# Altium footprint library Master.PcbLib: 28 footprints (part 2 of 2)
Each footprint in its own frame and in the unit in brackets; x right, y up, seen from the top. Pads: shape width x height; smd on the part's side, far side on the other; paste and mask are expansions set on the pad; w line width, h text height; cw(c..) or ccw(c..) is an arc to the next point about the centre after c.
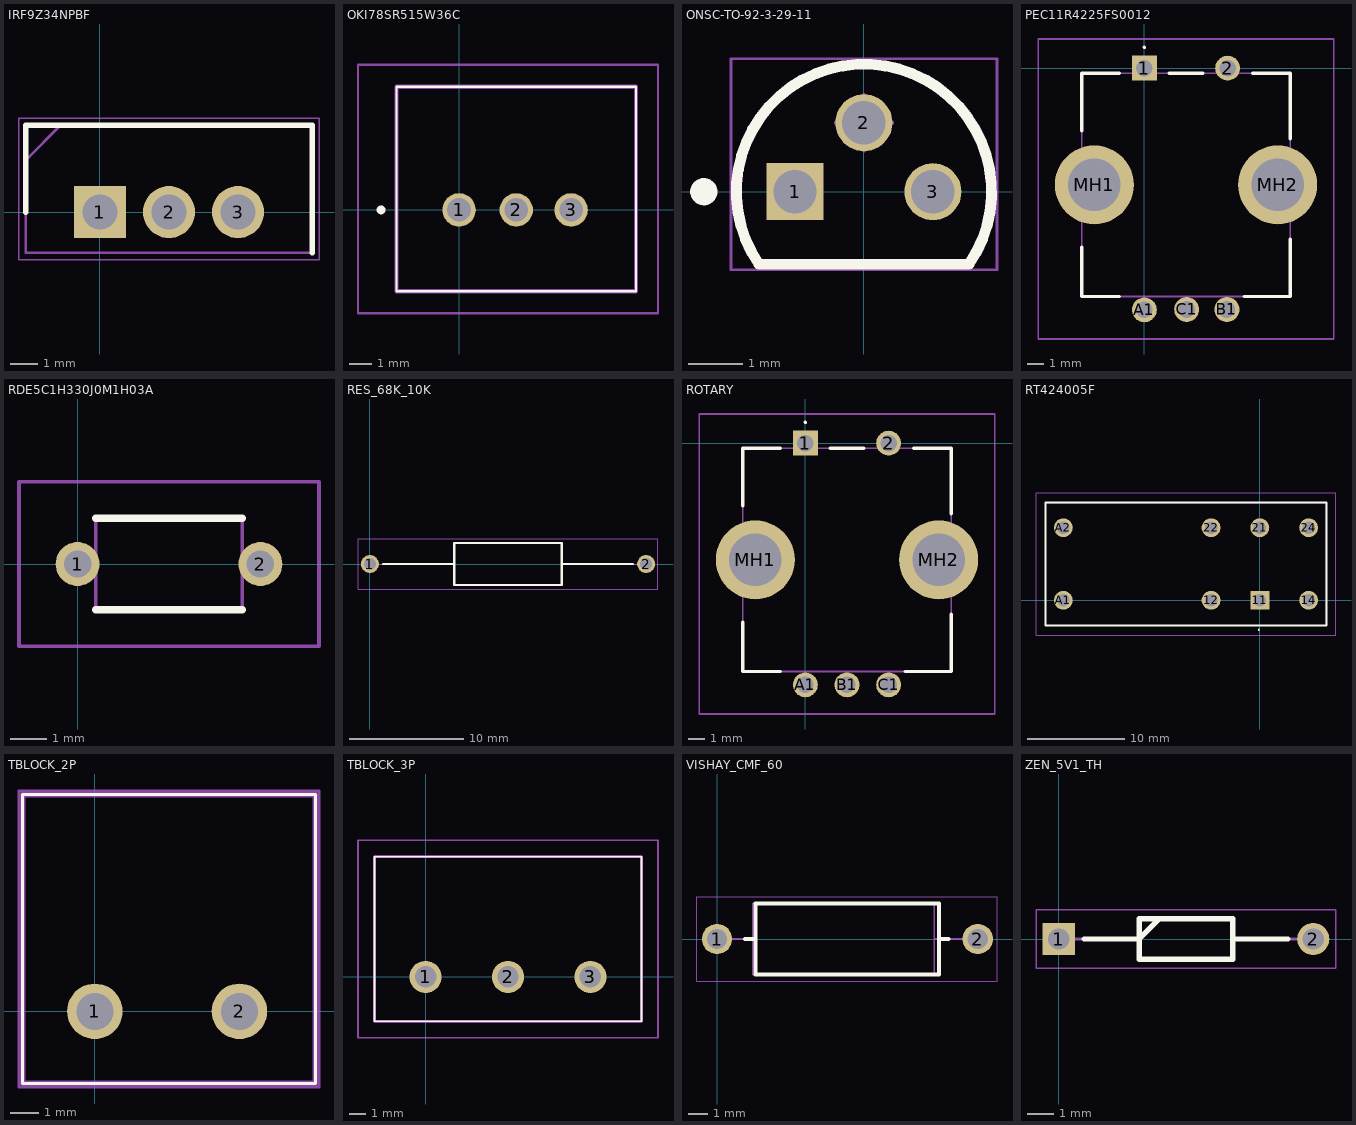
[diagram p1: the footprints below, top view; thin cyan lines are the x and y axes]

## IRF9Z34NPBF [mm] "MOSFET MOSFT PCh -55V -17A 100mOhm 23.3nC"
pads (3):
  rect 1.92x1.92 / inner round 1.92 / far side rect 1.92x1.92 hole 1.28: 1(0,0)
  round 1.92 hole 1.28: 2(2.54,0) 3(5.08,0)
Top Overlay:
  lines w0.2: -2.73,0 -2.73,3.195 7.81,3.195 7.81,-1.495
Mechanical 15:
  lines w0.1: -2.73,1.925 -1.46,3.195 ; -2.73,-1.495 -2.73,3.195 7.81,3.195 7.81,-1.495 -2.73,-1.495
Mechanical 20:
  lines w0.05: -2.98,-1.745 -2.98,3.445 8.06,3.445 8.06,-1.745 -2.98,-1.745
3D body "IRF9Z34NPBF.stp": height 18.84, standoff -17.51, extent -2.668,-1.495 7.748,3.195

## OKI78SR515W36C [mm]
pads (3):
  round 1.519 hole 1.08: 1(0,0) 2(2.6,0) 3(5.1,0)
Top Overlay:
  lines w0.1: -2.85,-3.7 8.05,-3.7 8.05,5.6 -2.85,5.6 -2.85,-3.7
  lines w0.3: -3.6,0 cw(c-3.55,0) -3.5,0 cw(c-3.55,0) -3.6,0
Mechanical 13:
  lines w0.2: -2.85,-3.7 8.05,-3.7 8.05,5.6 -2.85,5.6 -2.85,-3.7
Mechanical 15:
  lines w0.1: -4.6,-4.7 9.05,-4.7 9.05,6.6 -4.6,6.6 -4.6,-4.7
3D body "OKI-78SR-5_1.5-W36-C.stp": height 16.6, standoff -5, extent -2.85,-3.7 8.05,5.6

## ONSC-TO-92-3-29-11 [mm] "TO, 3-Leads, Body Dia 4.7mm, Pitch 1.27mm"
height 7.87
pads (3):
  rect 1.05x1.05 hole 0.8: 1(-1.27,0)
  round 1.05 hole 0.8: 2(0,1.27) 3(1.27,0)
Top Overlay:
  circle w0.25: c-2.95,0 r0.125
  lines w0.2: -1.934,-1.335 cw(c0,0) 1.934,-1.335 -1.934,-1.335
Mechanical 13:
  lines w0.1: -1.934,-1.335 cw(c0,0) 1.934,-1.335 -1.934,-1.335
Mechanical 15:
  lines w0.05: -2.45,-1.435 -2.45,2.45 2.45,2.45 2.45,-1.435 -2.45,-1.435
  lines w0.1: -0.5,1.27 0.5,1.27 ; 0,0.77 0,1.77
3D body: height 7.87, standoff 2.54, extent -2.349,-1.334 2.357,2.359

## PEC11R4225FS0012 [mm]
pads (7):
  rect 1.5x1.5 hole 1: 1(0,0)
  round 1.5 hole 1: 2(5,0) A1(0,-14.5) B1(4.953,-14.478) C1(2.54,-14.478)
  round 4.74 hole 3.16: MH1(-3,-7) MH2(8,-7)
Top Overlay:
  lines w0.1: 0,1.2 ccw(c0,1.25) 0,1.3 ccw(c0,1.25) 0,1.2
  lines w0.2: -3.75,-10.75 -3.75,-13.7 -1.5,-13.7 ; -3.75,-3.75 -3.75,-0.3 -1.5,-0.3 ; 1.5,-0.3 3.5,-0.3 ; 6,-13.7 8.75,-13.7 8.75,-10.25 ; 6.5,-0.3 8.75,-0.3 8.75,-4.25
Mechanical 13:
  lines w0.1: -3.75,-13.7 8.75,-13.7 8.75,-0.3 -3.75,-0.3 -3.75,-13.7
Mechanical 15:
  lines w0.1: -6.37,-16.25 11.37,-16.25 11.37,1.75 -6.37,1.75 -6.37,-16.25
3D body "Encoder v1.step": height 23.62, standoff -5.1, extent -4.48,-15.08 9.48,0.58

## RDE5C1H330J0M1H03A [mm]
pads (2):
  round 1.2 hole 0.75: 1(0,0) 2(5,0)
Top Overlay:
  lines w0.2: 0.5,-1.25 4.5,-1.25 ; 0.5,1.25 4.5,1.25
Mechanical 15:
  lines w0.1: 0.5,-1.25 4.5,-1.25 4.5,1.25 0.5,1.25 0.5,-1.25
Mechanical 20:
  lines w0.1: -1.6,-2.25 6.6,-2.25 6.6,2.25 -1.6,2.25 -1.6,-2.25
3D body "RDER71H104K0K1H03B_11.step": height 6.32, standoff -22.18, extent -0.249,-1.25 5.249,1.25

## RES_68K_10K [mm]
pads (2):
  round 1.575 hole 1.05: 1(0,0) 2(24.1,0)
Top Overlay:
  lines w0.2: 1.138,0 7.35,0 ; 16.75,0 22.962,0 ; 7.35,-1.84 7.35,1.84 16.75,1.84 16.75,-1.84 7.35,-1.84
Mechanical 13:
  lines w0.1: 0,0 7.35,0 ; 16.75,0 24.1,0 ; 7.35,-1.84 7.35,1.84 16.75,1.84 16.75,-1.84 7.35,-1.84
Mechanical 15:
  lines w0.05: -1.038,-2.19 -1.038,2.19 25.137,2.19 25.137,-2.19 -1.038,-2.19
3D body "CMF6010K000FKEB.stp": height 3.93, standoff -3.93, extent -0.43,-1.965 24.55,1.965

## ROTARY [mm] "Encoders 20mm SHAFT w/SWITCH"
pads (7):
  rect 1.5x1.5 hole 1: 1(0,0)
  round 1.5 hole 1: 2(5,0) A1(0,-14.5) B1(2.5,-14.5) C1(5,-14.5)
  round 4.74 hole 3.16: MH1(-3,-7) MH2(8,-7)
Top Overlay:
  lines w0.1: 0,1.2 cw(c0,1.25) 0,1.3 cw(c0,1.25) 0,1.2
  lines w0.2: -3.75,-10.75 -3.75,-13.7 -1.5,-13.7 ; -3.75,-3.75 -3.75,-0.3 -1.5,-0.3 ; 1.5,-0.3 3.5,-0.3 ; 6,-13.7 8.75,-13.7 8.75,-10.25 ; 6.5,-0.3 8.75,-0.3 8.75,-4.25
Mechanical 13:
  lines w0.1: -3.75,-13.7 -3.75,-0.3 8.75,-0.3 8.75,-13.7 -3.75,-13.7
Mechanical 15:
  lines w0.1: -6.37,-16.25 -6.37,1.75 11.37,1.75 11.37,-16.25 -6.37,-16.25
3D body "PEC11R-4225F-S0012.stp": height 31.6, standoff -5, extent -4.48,-14.897 9.48,0.397

## RT424005F [mm] "General Purpose Relays DPDT 8A 5VDC GEN PURPOSE RELAY"
pads (8):
  rect 1.95x1.95 hole 1.3: 11(0,0)
  round 1.95 hole 1.3: 12(-5.04,0) 14(5.04,0) 21(0,7.5) 22(-5.04,7.5) 24(5.04,7.5) A1(-20.3,0) A2(-20.3,7.5)
Top Overlay:
  lines w0.1: -0.1,-3.1 cw(c-0.1,-3.05) -0.1,-3 cw(c-0.1,-3.05) -0.1,-3.1
  lines w0.2: -22.13,-2.6 -22.13,10.1 6.87,10.1 6.87,-2.6 -22.13,-2.6
Mechanical 13:
  lines w0.1: -22.13,-2.6 -22.13,10.1 6.87,10.1 6.87,-2.6 -22.13,-2.6
Mechanical 15:
  lines w0.1: -23.13,-3.6 -23.13,11.1 7.87,11.1 7.87,-3.6 -23.13,-3.6
3D body "1-1419108-6.stp": height 15.8, standoff -3.5, extent -22.61,-2.5 6.39,10.2

## TBLOCK_2P [mm]
pads (2):
  round 1.95 hole 1.3: 1(0,0) 2(5.08,0)
Top Overlay:
  lines w0.1: -2.54,-2.54 -2.54,7.62 7.747,7.62 7.747,-2.54 -2.54,-2.54
Mechanical 13:
  lines w0.2: -2.54,-2.54 -2.54,7.62 7.747,7.62 7.747,-2.54 -2.54,-2.54
Mechanical 15:
  lines w0.1: -2.667,-2.667 -2.667,7.747 7.874,7.747 7.874,-2.667 -2.667,-2.667
3D body "TBlock2_2P_5mm.step": height 7.71, standoff -4.99, extent -2.46,-2.428 7.7,7.572

## TBLOCK_3P [mm]
pads (3):
  round 1.95 hole 1.3: 1(0,0) 2(5,0) 3(10,0)
Top Overlay:
  lines w0.1: -3.1,-2.7 -3.1,7.3 13.1,7.3 13.1,-2.7 -3.1,-2.7
Mechanical 13:
  lines w0.2: -3.1,-2.7 -3.1,7.3 13.1,7.3 13.1,-2.7 -3.1,-2.7
Mechanical 15:
  lines w0.1: -4.1,-3.7 -4.1,8.3 14.1,8.3 14.1,-3.7 -4.1,-3.7
3D body "TBlock2_3P_5mm.step": height 7.8, standoff -5, extent -3.02,-2.667 13.18,7.333

## VISHAY_CMF_60 [mm] "Vishay CMF 60 series"
pads (2):
  round 1.575 hole 1.05: 1(0,0) 2(13.5,0)
Top Overlay:
  lines w0.2: 1.448,0 2,0 ; 11.5,0 11.989,0 ; 2,-1.84 11.5,-1.84 11.5,1.84 2,1.84 2,-1.84
Mechanical 13:
  lines w0.1: 0,0 1.85,0 ; 11.25,0 13.475,0 ; 1.85,-1.84 1.85,1.84 11.25,1.84 11.25,-1.84 1.85,-1.84
Mechanical 15:
  lines w0.05: -1.038,-2.19 -1.038,2.19 14.5,2.19 14.5,-2.19 -1.038,-2.19
3D body "resistor_new v10.step": height 3.68, standoff -4.02, extent -0.355,-1.743 13.855,1.625

## ZEN_5V1_TH [mm]
pads (2):
  rect 1.2x1.2 hole 0.8: 1(0,0)
  round 1.2 hole 0.8: 2(9.5,0)
Top Overlay:
  lines w0.2: 0.95,0 3,0 3.75,0.75 ; 6.5,0 8.55,0 ; 3,-0.75 3,0.75 6.5,0.75 6.5,-0.75 3,-0.75
Mechanical 13:
  lines w0.1: 0,0 3,0 3.75,0.75 ; 6.5,0 9.5,0 ; 3,-0.75 3,0.75 6.5,0.75 6.5,-0.75 3,-0.75
Mechanical 15:
  lines w0.05: -0.85,-1.1 -0.85,1.1 10.35,1.1 10.35,-1.1 -0.85,-1.1
3D body "TZX5V1B-TR.stp": height 1.7, standoff -1.7, extent -0.3,-0.844 9.8,0.844